# Altium footprint library SG__PCB_HOLE_Connector.PcbLib: 154 footprints (part 3 of 10)
Each footprint in its own frame and in the unit in brackets; x right, y up, seen from the top. Pads: shape width x height; smd on the part's side, far side on the other; paste and mask are expansions set on the pad; w line width, h text height; cw(c..) or ccw(c..) is an arc to the next point about the centre after c.
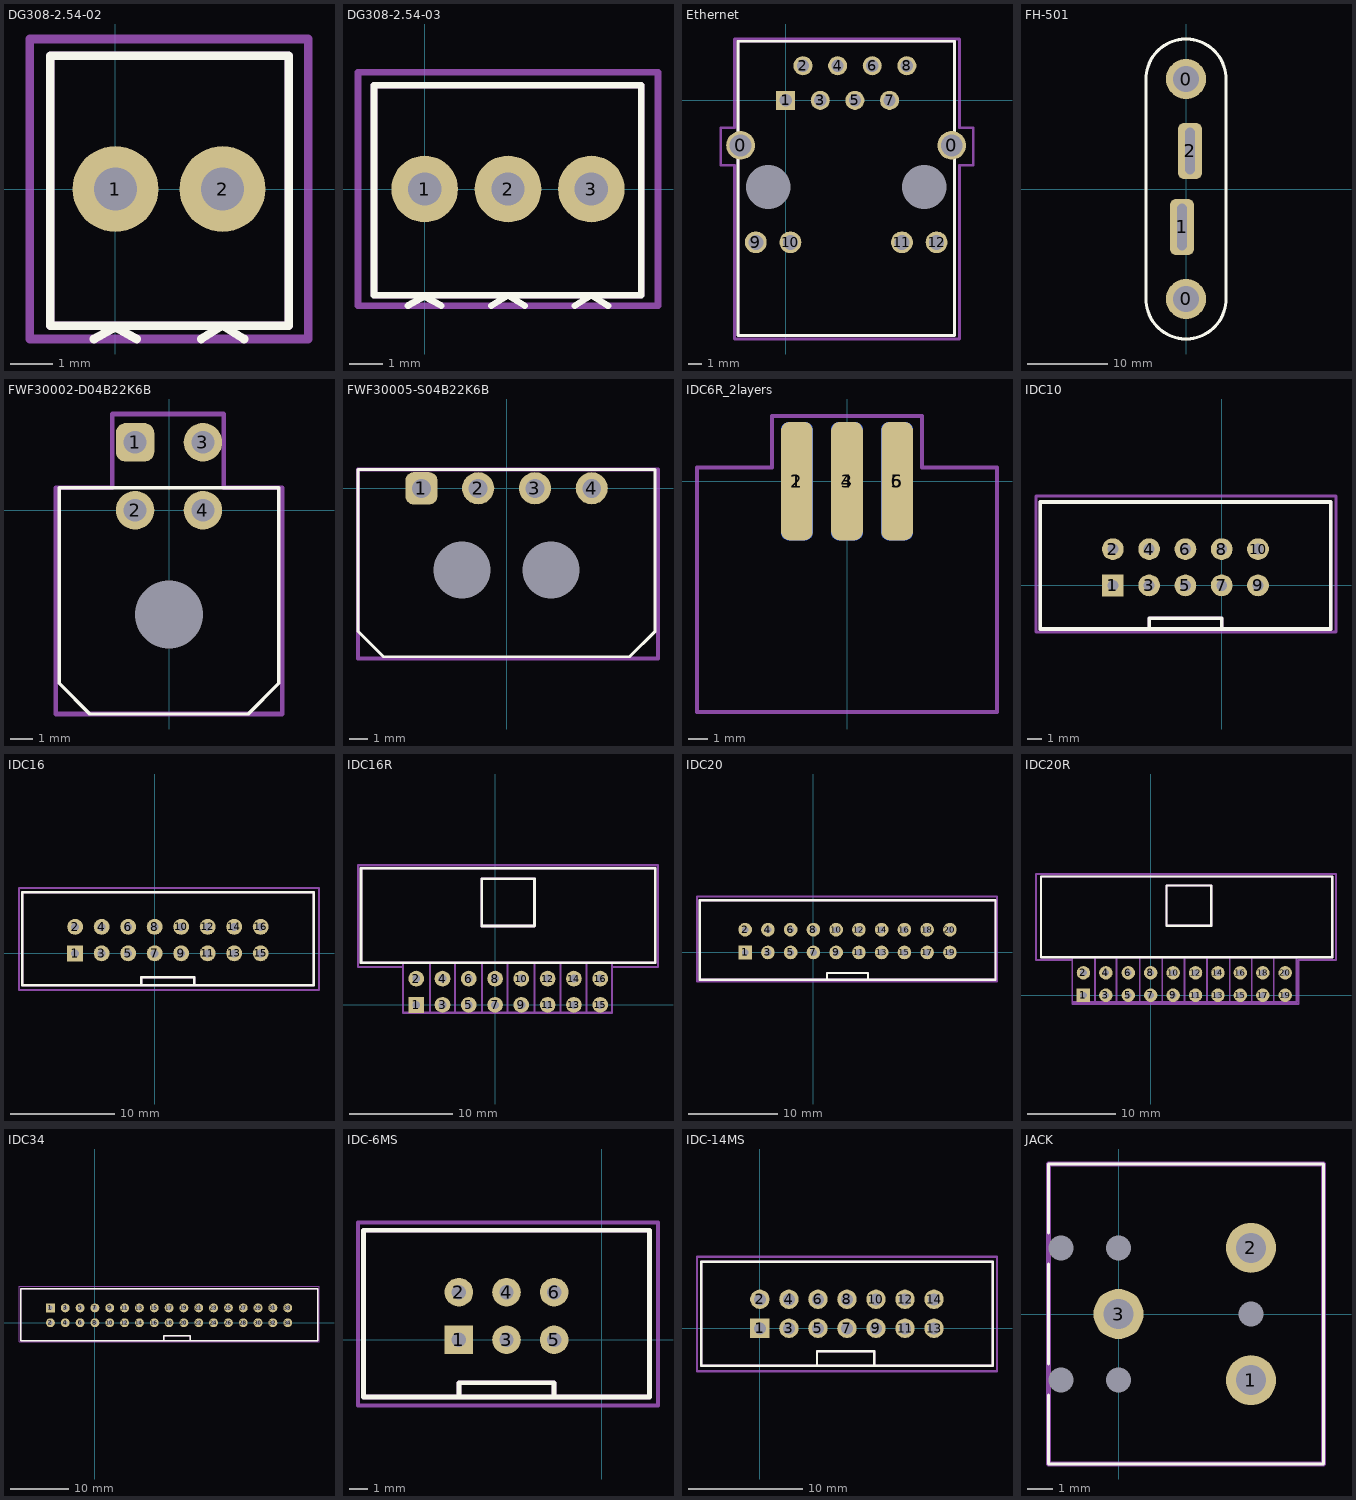
[diagram p2: the footprints below, top view; thin cyan lines are the x and y axes]

## DG308-2.54-02 [mm]
pads (2):
  round 2 hole 1: 1(0,0) 2(2.5,0)
Top Overlay:
  lines w0.2: -0.5,-3.5 -0.008,-3.226 0.5,-3.5 ; 2,-3.5 2.5,-3.186 3,-3.5 ; -1.518,-3.186 -1.518,3.114 4.042,3.114 4.042,-3.186 -1.518,-3.186
Top Assembly:
  lines w0.2: -1.518,-3.186 -1.518,3.114 4.042,3.114 4.042,-3.186 -1.518,-3.186
Top Courtyard:
  lines w0.2: -2,-3.5 -2,3.5 4.5,3.5 4.5,-3.5 -2,-3.5
3D body "DG308-2.54-02.stp": height 8.55, standoff -3.6, extent -1.518,-3.186 4.042,3.114

## DG308-2.54-03 [mm]
pads (3):
  round 2 hole 1: 1(0,0) 2(2.5,0) 3(5,0)
Top Overlay:
  lines w0.2: -0.5,-3.5 -0.008,-3.226 0.5,-3.5 ; 2,-3.5 2.5,-3.186 3,-3.5 ; 4.5,-3.5 5,-3.186 5.5,-3.5 ; -1.518,-3.186 6.5,-3.186 6.5,3.114 -1.518,3.114 -1.518,-3.186
Top Assembly:
  lines w0.2: -1.518,-3.186 6.5,-3.186 6.5,3.114 -1.518,3.114 -1.518,-3.186
Top Courtyard:
  lines w0.2: -2,-3.5 7,-3.5 7,3.5 -2,3.5 -2,-3.5
3D body "DG308-2.54-03.stp": height 8.55, standoff -3.6, extent -1.6,-3.15 6.5,3.15

## Ethernet [mm]
pads (16):
  round 2.1 hole 1.6: 0(-3.305,-3.3) 0(12.185,-3.3)
  round 0 hole 3.25: 0(-1.275,-6.35) 0(10.155,-6.35)
  rect 1.4x1.4 hole 0.9: 1(0,0)
  round 1.4 hole 0.9: 2(1.27,2.54) 3(2.54,0) 4(3.81,2.54) 5(5.08,0) 6(6.35,2.54) 7(7.62,0) 8(8.89,2.54)
  round 1.6 hole 1.1: 9(-2.19,-10.41) 10(0.35,-10.41) 11(8.53,-10.41) 12(11.07,-10.41)
Top Overlay:
  lines w0.2: -3.5,-17.25 4.44,-17.25 12.38,-17.25 12.38,4.34 4.44,4.34 -3.5,4.34 -3.5,-17.25
Top Assembly:
  lines w0.2: -3.5,-17.25 -3.5,4.34 4.44,4.34 12.38,4.34 12.38,-17.25 4.44,-17.25 -3.5,-17.25
Top Courtyard:
  lines w0.2: -4.75,-4.75 -4.75,-2 -3.75,-2 -3.75,4.5 12.75,4.5 12.75,-2 13.75,-2 13.75,-4.75 12.75,-4.75 12.75,-17.5 12.5,-17.5 -3.75,-17.5 -3.75,-4.75 -4.75,-4.75

## FH-501 [mm]
pads (4):
  round 5 hole 3.2: 0(0,-13.75) 0(0,13.75)
  rrect50% 3x7 hole 1.2 slot 5.8 at 90 deg: 1(-0.5,-4.75) 2(0.5,4.75)
Top Overlay:
  lines w0.4: -5,-13.75 ccw(c0,-13.75) 5,-13.75 5,13.75 ccw(c0,13.75) -5,13.75 -5,-13.75

## FWF30002-D04B22K6B [mm]
pads (5):
  rrect50% 1.7x1.7 hole 1: 1(-1.5,3)
  round 1.7 hole 1: 2(-1.5,0) 3(1.5,3) 4(1.5,0)
  round 1.5 hole 3 unplated: ""(0,-4.6)
Top Overlay:
  lines w0.152: -4.85,-7.65 -3.5,-9 3.5,-9 4.85,-7.65 4.85,1 0,1 -4.85,1 -4.85,-7.65
Top Courtyard:
  lines w0.2: -5,-9 -5,1 -2.5,1 -2.5,4.25 2.425,4.25 2.425,1 5,1 5,-9 -5,-9
3D body: height 7.37, standoff 0, extent -4.85,-9 4.85,1
3D body: height 3.3, standoff -3.2, extent 0.744,-5.85 1.958,-3.35
3D body: height 3.3, standoff -3.2, extent -1.928,-5.85 -0.714,-3.35

## FWF30005-S04B22K6B [mm]
pads (6):
  rrect50% 1.7x1.7 hole 1: 1(-4.5,0)
  round 1.7 hole 1: 2(-1.5,0) 3(1.5,0) 4(4.5,0)
  round 1.5 hole 3 unplated: ""(-2.35,-4.32) ""(2.35,-4.32)
Top Overlay:
  lines w0.152: -7.85,-7.55 -6.5,-8.9 6.5,-8.9 7.85,-7.55 7.85,1 0,1 -7.85,1 -7.85,-7.55
Top Courtyard:
  lines w0.2: -7.85,-9 8,-9 8,1 -7.85,1 -7.85,-9
3D body: height 4.37, standoff 0, extent -7.85,-8.9 7.85,1
3D body: height 3.3, standoff -3.2, extent -4.314,-5.56 -3.1,-3.06
3D body: height 3.3, standoff -3.2, extent 3.1,-5.56 4.314,-3.06

## IDC6R_2layers [mm]
pads (6):
  rrect50% 1.6x6 smd far side: 1(-2.54,0) 3(0,0) 5(2.54,0)
  rrect50% 1.6x6 smd: 2(-2.54,0) 4(0,0) 6(2.54,0)
Top Assembly:
  lines w0.2: -7.61,-11.71 -7.61,0.69 -3.81,0.69 -3.81,3.302 3.81,3.302 3.81,0.69 7.61,0.69 7.61,-11.71 -7.61,-11.71
Top Courtyard:
  lines w0.2: -7.61,-11.71 -7.61,0.69 -3.81,0.69 -3.81,3.302 3.81,3.302 3.81,0.69 7.61,0.69 7.61,-11.71 -7.61,-11.71
Bottom Courtyard:
  lines w0.2: -7.61,-11.71 7.61,-11.71 7.61,0.69 3.81,0.69 3.81,3.302 -3.81,3.302 -3.81,0.69 -7.61,0.69 -7.61,-11.71
3D body "IDC-6MS.step": height 4.37, standoff -4.48, extent -7.61,-11.71 7.61,0.69

## IDC10 [mil]
pads (10):
  rect 60x60 hole 30: 1(-300,0)
  round 60 hole 30: 2(-300,100) 3(-200,0) 4(-200,100) 5(-100,0) 6(-100,100) 7(0,0) 8(0,100) 9(100,0) 10(100,100)
Top Overlay:
  lines w10: -200,-120 -200,-90 0,-90 0,-120 ; -500,-120 -500,230 300,230 300,-120 -500,-120
Top Assembly:
  lines w10: -200,-120 -200,-90 0,-90 0,-120 ; -500,-120 -500,230 300,230 300,-120 -500,-120
Top Courtyard:
  lines w7.87: -511.81,-127.95 314.96,-127.95 314.96,246.06 -511.81,246.06 -511.81,-127.95
3D body "IDC-10M.STEP": height 366.14, standoff -122.05, extent -499.61,-123.23 299.61,235.04

## IDC16 [mil]
pads (16):
  rect 60x60 hole 30: 1(-300,0)
  round 60 hole 30: 2(-300,100) 3(-200,0) 4(-200,100) 5(-100,0) 6(-100,100) 7(0,0) 8(0,100) 9(100,0) 10(100,100) 11(200,0) 12(200,100) 13(300,0) 14(300,100) 15(400,0) 16(400,100)
Top Overlay:
  lines w10: -50,-120 -50,-90 0,-90 150,-90 150,-120 ; -500,-120 -500,230 600,230 600,-120 -500,-120
Top Assembly:
  lines w10: -50,-120 -50,-90 0,-90 150,-90 150,-120 ; -500,-120 -500,230 600,230 600,-120 -500,-120
Top Courtyard:
  lines w7.87: -511.81,-137.8 620.08,-137.8 620.08,246.06 -511.81,246.06 -511.81,-137.8
3D body "IDC16.step": height 359.45, standoff -128.74, extent -499.61,-118.43 599.6,230

## IDC16R [mil]
pads (16):
  rect 60x60 hole 30: 1(-300,0)
  round 60 hole 30: 2(-300,100) 3(-200,0) 4(-200,100) 5(-100,0) 6(-100,100) 7(0,0) 8(0,100) 9(100,0) 10(100,100) 11(200,0) 12(200,100) 13(300,0) 14(300,100) 15(400,0) 16(400,100)
Top Overlay:
  lines w10: -510,160 -510,520 610,520 610,160 -510,160 ; -50,300 -50,480 150,480 150,300 -50,300
Top Assembly:
  lines w7.87: -349.43,160 -350,160 -350,-30 444.7,-30 444.7,160 ; -249.82,160 -247.97,160 -247.97,-30 ; -152.97,-30 -152.97,160 -149.28,160 ; -50,-30 -50,160 ; 47.35,-30 47.35,160 50,160 ; 150,-30 150,160 ; 249.16,-30 249.16,160 ; 347.85,-30 347.85,160 350.62,160
  lines w10: -510,160 -510,520 610,520 610,160 -510,160 ; -50,300 -50,480 150,480 150,300 -50,300
Top Courtyard:
  lines w7.87: -521.65,144.9 -521.65,531.5 620.08,531.5 620.08,144.9 444.7,144.9 444.7,-30 -350,-30 -350,144.9 -521.65,144.9
3D body "IDC16R.step": height 353.54, standoff -93.31, extent -510,-16.93 614.41,516.93

## IDC20 [mil]
pads (20):
  rect 60x60 hole 30: 1(-300,0)
  round 60 hole 30: 2(-300,100) 3(-200,0) 4(-200,100) 5(-100,0) 6(-100,100) 7(0,0) 8(0,100) 9(100,0) 10(100,100) 11(200,0) 12(200,100) 13(300,0) 14(300,100) 15(400,0) 16(400,100) 17(500,0) 18(500,100) 19(600,0) 20(600,100)
Top Overlay:
  lines w10: 60,-120 60,-90 240,-90 240,-120 ; -500,-120 800,-120 800,230 -500,230 -500,-120
Top Assembly:
  lines w10: 60,-120 60,-90 240,-90 240,-120 ; -500,-120 800,-120 800,230 -500,230 -500,-120
Top Courtyard:
  lines w7.87: -511.81,-127.95 807.09,-127.95 807.09,246.06 -511.81,246.06 -511.81,-127.95
3D body "IDC20.step": height 379.13, standoff -109.06, extent -499.61,-127.32 799.61,221.1

## IDC20R [mil]
pads (20):
  rect 60x60 hole 30: 1(-300,0)
  round 60 hole 30: 2(-300,100) 3(-200,0) 4(-200,100) 5(-100,0) 6(-100,100) 7(0,0) 8(0,100) 9(100,0) 10(100,100) 11(200,0) 12(200,100) 13(300,0) 14(300,100) 15(400,0) 16(400,100) 17(500,0) 18(500,100) 19(600,0) 20(600,100)
Top Overlay:
  lines w10: -490,170 810,170 810,530 -490,530 -490,170 ; 70,310 270,310 270,490 70,490 70,310
Top Assembly:
  lines w7.87: -352.46,170 -350,170 -350,-30 651,-30 651,170 ; -248.87,-30 -248.87,170 ; -152.61,-30 -152.61,170 ; -49.73,-30 -48.79,-30 -48.79,170 ; 49.37,170 51.25,170 51.25,-30 ; 150.35,170 150.5,170 150.5,-30 ; 248.51,170 251.34,170 251.34,-30 ; 351.38,170 352.32,170 352.32,-30 ; 450.48,-30 450.48,170 ; 548.63,-30 548.63,170 550.52,170
  lines w10: -490,170 -490,530 810,530 810,170 -490,170 ; 70,310 270,310 270,490 70,490 70,310
Top Courtyard:
  lines w7.87: -511.81,157.48 -511.81,541.34 826.77,541.34 826.77,157.48 659.45,157.48 659.45,-39.37 -350,-39.37 -350,157.48 -511.81,157.48
3D body "IDC20r.step": height 353.54, standoff -93.31, extent -504.41,-6.93 820,526.93

## IDC34 [mil]
pads (35):
  rect 60x60 hole 30: 1(-300,100)
  round 60 hole 30: 2(-300,0) 3(-200,100) 4(-200,0) 5(-100,100) 6(-100,0) 7(0,100) 8(0,0) 9(100,100) 10(100,0) 11(200,100) 12(200,0) 13(300,100) 14(300,0) 15(400,100) 16(400,0) 17(500,100) 18(500,0) 19(600,100) 20(600,0) 21(700,100) 22(700,0) 23(800,100) 24(800,0) 25(900,100) 26(900,0) 27(1000,100) 28(1000,0) 29(1100,100) 30(1100,0) 31(1200,100) 32(1200,0) 33(1300,100) 34(1300,0) !-1(600,100)
Top Overlay:
  lines w10: 464,-119 464,-89 644,-89 644,-119 ; -500,-120 1502,-120 1502,230 -500,230 -500,-120
Top Assembly:
  lines w10: 464,-119 464,-89 644,-89 644,-119 ; -500,-120 1503,-120 1503,230 -500,230 -500,-120
Top Courtyard:
  lines w7.87: -511.81,-127.95 1511,-127.95 1511,246.06 -511.81,246.06 -511.81,-127.95
3D body "User Library-DS1013-34S (IDC-34MS CONNFLY).step": height 354.33, standoff -141.73, extent -506.09,-127.2 1501,223.2

## IDC-6MS [mil]
pads (6):
  rect 60x60 hole 30: 1(-300,0)
  round 60 hole 30: 2(-300,100) 3(-200,0) 4(-200,100) 5(-100,0) 6(-100,100)
Top Overlay:
  lines w10: -300,-120 -300,-90 -100,-90 -100,-120 ; -500,-120 100,-120 100,230 -500,230 -500,-120
Top Assembly:
  lines w10: -300,-120 -300,-90 -100,-90 -100,-120 ; -500,-120 100,-120 100,230 -500,230 -500,-120
Top Courtyard:
  lines w7.87: -511.81,-137.8 118.11,-137.8 118.11,246.06 -511.81,246.06 -511.81,-137.8
3D body "IDC-6MS.step": height 379.13, standoff -109.06, extent -500,-120 99.21,228.42

## IDC-14MS [mm]
height 12
pads (14):
  rect 1.7x1.7 hole 1.05 mask+0.05: 1(0,0)
  round 1.7 hole 1.05 mask+0.05: 2(0,2.54) 3(2.54,0) 4(2.54,2.54) 5(5.08,0) 6(5.08,2.54) 7(7.62,0) 8(7.62,2.54) 9(10.16,0) 10(10.16,2.54) 11(12.7,0) 12(12.7,2.54) 13(15.24,0) 14(15.24,2.54)
Top Overlay:
  lines w0.2: 5,-3.28 5,-2 10,-2 10,-3.28 ; -5.12,-3.28 -5.12,5.82 20.37,5.82 20.37,-3.28 -5.12,-3.28
Top Assembly:
  lines w0.2: 5,-3.28 5,-2 10,-2 10,-3.28 ; -5.12,-3.28 20.37,-3.28 20.37,5.82 -5.12,5.82 -5.12,-3.28
Top Courtyard:
  lines w0.2: -5.5,-3.75 20.75,-3.75 20.75,6.25 -5.5,6.25 -5.5,-3.75
3D body "IDC-14MS.STEP": height 9.25, standoff -3.45, extent -5.08,-3.405 20.32,5.945

## JACK [mm]
pads (8):
  round 0 hole 1: 0(-2.3,-2.65) 0(-2.3,2.65) 0(0,-2.65) 0(0,2.65) 0(5.3,0)
  round 2 hole 1.2: 1(5.3,-2.65) 2(5.3,2.65) 3(0,0)
Top Overlay:
  lines w0.127: -2.8,-3.25 -2.8,-6 8.2,-6 8.2,6 -2.8,6 -2.8,3.25 ; -2.8,-2 -2.8,2
Top Assembly:
  lines w0.127: -2.8,-6 -2.8,6 8.2,6 8.2,-6 -2.8,-6
Top Courtyard:
  lines w0.2: -2.8,-6 8.2,-6 8.2,6 -2.8,6 -2.8,-6